# Altium footprint library Connectors.PcbLib: 92 footprints (part 1 of 6)
Each footprint in its own frame and in the unit in brackets; x right, y up, seen from the top. Pads: shape width x height; smd on the part's side, far side on the other; paste and mask are expansions set on the pad; w line width, h text height; cw(c..) or ccw(c..) is an arc to the next point about the centre after c.
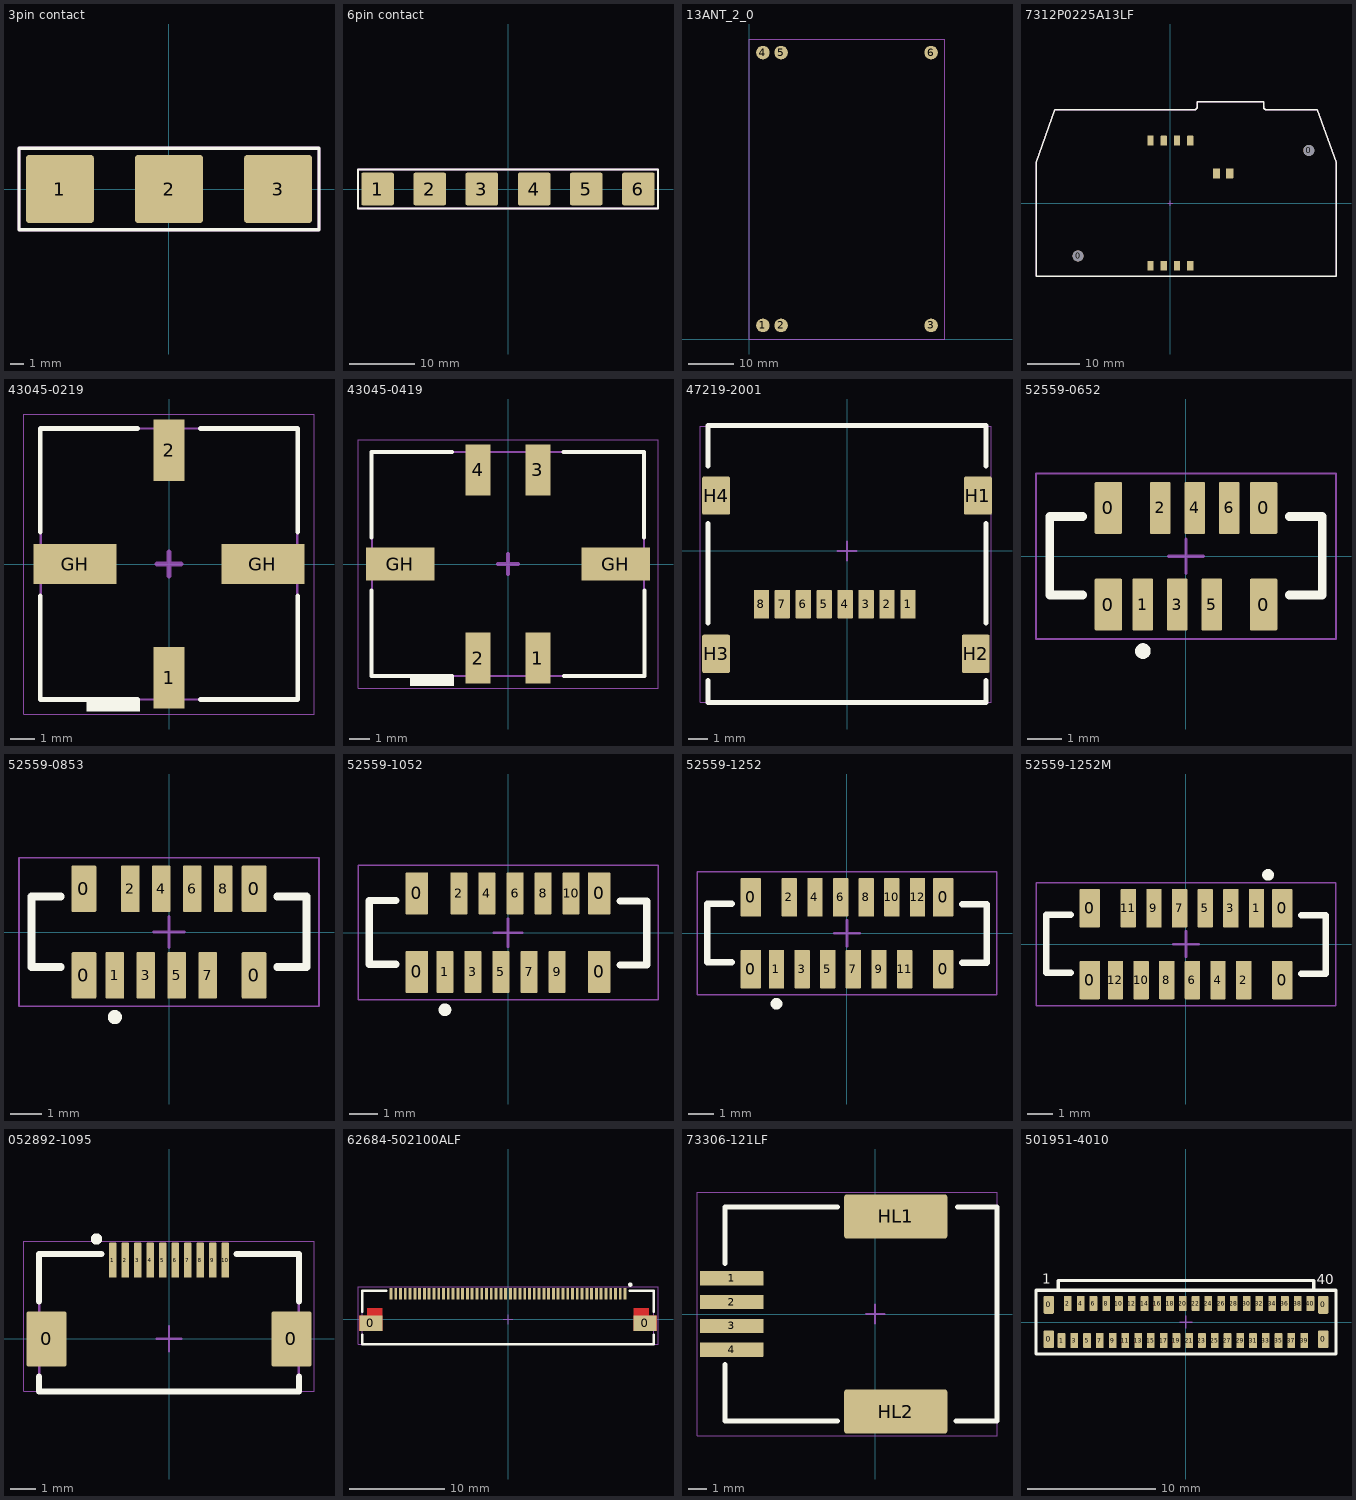
[diagram p0: the footprints below, top view; thin cyan lines are the x and y axes]

## 3pin contact [mm]
pads (3):
  rrect10% 5x5 smd: 1(-8,0) 2(0,0) 3(8,0)
Top Overlay:
  lines w0.254: -11,-3 -11,3 11,3 11,-3 -11,-3
Mechanical 13:
  lines w0.254: -11,-3 11,-3 11,3 -11,3 -11,-3
  text ".Designator" at -1.995,4.025 h0.51
  text ".Comment" at -1.97,3.325 h0.51
Mechanical 15:
  lines w0.05: -11,-3 11,-3 11,3 -11,3 -11,-3
  lines w0.1: -0.5,0 0.5,0 ; 0,-0.5 0,0.5

## 6pin contact [mm]
pads (6):
  rrect10% 5x5 smd: 1(-20,0) 2(-12,0) 3(-4,0) 4(4,0) 5(12,0) 6(20,0)
Top Overlay:
  lines w0.254: -23,-3 23,-3 23,3 -23,3 -23,-3
Mechanical 13:
  lines w0.254: -23,-3 -23,3 23,3 23,-3 -23,-3
  text ".Comment" at -2.17,3.325 h0.51
  text ".Designator" at -2.195,4.025 h0.51
Mechanical 15:
  lines w0.05: -23,-3 -23,3 23,3 23,-3 -23,-3
  lines w0.1: -20.5,0 -19.5,0 ; -20,-0.5 -20,0.5

## 13ANT_2_0 [mm] "13.56MHz Y Soft Antenna v2.0"
height 4.5
pads (6):
  round 3 smd: 1(3,3) 2(7,3) 3(40,3) 4(3,63) 5(7,63) 6(40,63)
Mechanical 13:
  lines w0.1: 0,0 43,0 43,66 0,66 0,0
  text ".Comment" at 19.83,2.525 h0.51
  text ".Designator" at 19.805,3.225 h0.51
Mechanical 15:
  lines w0.1: 0,0 0,66 43,66 43,0 0,0
3D body "OEM_LF_HF_Antenna_2.0.step": height 4.35, standoff 0, extent 0,0 43,66

## 7312P0225A13LF [mm] "Smart Card IC Chip Card Connector, 8 cts, Surface Mount"
height 3.6
pads (12):
  round 2.1 hole 2.1 unplated: 0(-17.78,-10.16) 0(26.67,10.16)
  rrect10% 1.2x1.9 smd: 1(-3.81,12.05) 2(-1.27,12.05) 3(1.27,12.05) 4(-3.81,-12.05) 5(-1.27,-12.05) 6(1.27,-12.05) 7(3.81,12.05) 8(3.81,-12.05)
  rrect10% 1.4x1.9 smd: 9(8.89,5.75) 10(11.43,5.75)
Top Overlay:
  lines w0.254: -25.89,-14.1 31.91,-14.1 31.91,7.9 28.26,18 18.53,18 cw(c18.53,18.56) 17.97,18.56 17.97,19.58 5.17,19.58 5.17,18.56 cw(c4.61,18.56) 4.61,18 -22.24,18 -25.89,7.9 -25.89,-14.1
Mechanical 13:
  text ".Designator" at -2.625,-2.015 h0.51
  text ".Comment" at -2.6,-2.715 h0.51
Mechanical 15:
  lines w0.1: -0.5,0 0.5,0 ; 0,-0.5 0,0.5 ; -25.89,-14.1 -25.89,7.9 -22.24,18 4.61,18 ccw(c4.61,18.56) 5.17,18.56 5.17,19.58 17.97,19.58 17.97,18.56 ccw(c18.53,18.56) 18.53,18 28.26,18 31.91,7.9 31.91,-14.1 -25.89,-14.1
3D body "7312P0225A13LFC.step": height 3.56, standoff -0.79, extent -25.92,-14.1 31.88,19.6

## 43045-0219 [mm] "Micro-Fit 3.0™ Vertical Header, 3.00mm Pitch, Dual Row, 2 Circuits, with Solder Tab"
height 9.91
pads (4):
  rect 1.27x2.54 smd: 1(0,-4.7) 2(0,4.7)
  rect 3.43x1.65 smd: GH(-3.885,0) GH(3.885,0)
Top Overlay:
  rectangle: -3.4,-6.1 -1.2,-5.6
  lines w0.2: -5.325,-1.325 -5.325,-5.6 -1.3,-5.6 ; -5.325,1.325 -5.325,5.6 -1.3,5.6 ; 1.3,-5.6 5.325,-5.6 5.325,-1.325 ; 1.3,5.6 5.325,5.6 5.325,1.325
Mechanical 13:
  lines w0.1: -5.3,-5.6 -5.3,5.6 5.3,5.6 5.3,-5.6 -5.3,-5.6
  text ".Designator" at -2.425,2.2 h0.51
  text ".Comment" at -2.4,1.5 h0.51
Mechanical 15:
  lines w0.05: -6,-6.2 -6,6.2 6,6.2 6,-6.2 -6,-6.2
  lines w0.2: -0.5,0 0.5,0 ; 0,-0.5 0,0.5
3D body "430450219.molex.stp": height 9.96, standoff 0, extent -5.325,-5.6 5.325,5.6

## 43045-0419 [mm] "Micro-Fit 3.0™ Vertical Header, 3.00mm Pitch, Dual Row, 4 Circuits, with Solder Tab"
height 9.91
pads (6):
  rect 1.27x2.54 smd: 1(1.5,-4.7) 2(-1.5,-4.7) 3(1.5,4.7) 4(-1.5,4.7)
  rect 3.43x1.65 smd: GH(-5.385,0) GH(5.385,0)
Top Overlay:
  rectangle: -4.9,-6.1 -2.7,-5.6
  lines w0.2: -6.825,-1.325 -6.825,-5.6 -2.8,-5.6 ; -6.825,1.325 -6.825,5.6 -2.8,5.6 ; 2.775,5.6 6.8,5.6 6.8,1.325 ; 2.8,-5.6 6.825,-5.6 6.825,-1.325
Mechanical 13:
  lines w0.1: -6.8,-5.6 6.8,-5.6 6.8,5.6 -6.8,5.6 -6.8,-5.6
  text ".Designator" at -2.125,0.1 h0.51
  text ".Comment" at -2.1,-0.6 h0.51
Mechanical 15:
  lines w0.05: -7.5,-6.2 7.5,-6.2 7.5,6.2 -7.5,6.2 -7.5,-6.2
  lines w0.2: -0.5,0 0.5,0 ; 0,-0.5 0,0.5
3D body "430450419.molex.stp": height 9.96, standoff 0, extent -6.825,-5.6 6.825,5.6

## 47219-2001 [mm]
height 1.1
pads (12):
  rrect10% 0.8x1.5 smd: 1(3.205,-2.8) 2(2.105,-2.8) 3(1.005,-2.8) 4(-0.095,-2.8) 5(-1.195,-2.8) 6(-2.295,-2.8) 7(-3.395,-2.8) 8(-4.495,-2.8)
  rrect10% 1.45x2 smd: H1(6.875,2.9) H2(6.76,-5.4) H3(-6.875,-5.4) H4(-6.875,2.9)
Top Overlay:
  lines w0.254: -7.295,-6.8 -7.295,-7.95 7.305,-7.95 7.305,-6.8 ; -7.295,-3.8 -7.295,1.45 ; -7.295,4.45 -7.295,6.575 7.305,6.575 7.305,4.45 ; 7.305,-3.8 7.305,1.45
Mechanical 13:
  text ".Comment" at -3.67,-1.475 h0.51
  text ".Designator" at -3.695,-0.775 h0.51
Mechanical 15:
  lines w0.05: -7.695,-7.95 -7.695,6.55 7.58,6.55 7.58,-7.95 -7.695,-7.95
  lines w0.1: -0.5,0 0.5,0 ; 0,-0.5 0,0.5
3D body "472192001.stp": height 1.9, standoff 0, extent -7.29,-7.955 7.31,6.545

## 52559-0652 [mm]
height 5.3
pads (10):
  rrect10% 0.8x1.5 smd: 0(-2.25,-1.4) 0(-2.25,1.4) 0(2.25,-1.4) 0(2.25,1.4)
  rrect10% 0.6x1.5 smd: 1(-1.25,-1.4) 2(-0.75,1.4) 3(-0.25,-1.4) 4(0.25,1.4) 5(0.75,-1.4) 6(1.25,1.4)
Top Overlay:
  circle w0.254: c-1.25,-2.75 r0.1
  lines w0.254: -3,-1.125 -3.95,-1.125 -3.95,1.15 -3,1.15 ; 3,-1.125 3.95,-1.125 3.95,1.15 3,1.15
Mechanical 13:
  lines w0.1: -3,-1.125 -3.95,-1.125 -3.95,1.15 -3,1.15 ; 3,-1.125 3.95,-1.125 3.95,1.15 3,1.15
  text ".Comment" at -2.3,-0.55 h0.51
  text ".Designator" at -2.325,0.15 h0.51
Mechanical 15:
  lines w0.05: -4.35,-2.4 4.35,-2.4 4.35,2.4 -4.35,2.4 -4.35,-2.4
  lines w0.1: -0.5,0 0.5,0 ; 0,-0.5 0,0.5
3D body "525590652.stp": height 5.3, standoff 0, extent -4.35,-1.65 4.35,1.85

## 52559-0853 [mm]
height 5.3
pads (12):
  rrect10% 0.8x1.5 smd: 0(-2.75,-1.4) 0(-2.75,1.4) 0(2.75,-1.4) 0(2.75,1.4)
  rrect10% 0.6x1.5 smd: 1(-1.75,-1.4) 2(-1.25,1.4) 3(-0.75,-1.4) 4(-0.25,1.4) 5(0.25,-1.4) 6(0.75,1.4) 7(1.25,-1.4) 8(1.75,1.4)
Top Overlay:
  circle w0.254: c-1.75,-2.75 r0.1
  lines w0.254: -3.5,-1.125 -4.45,-1.125 -4.45,1.15 -3.5,1.15 ; 3.5,-1.125 4.45,-1.125 4.45,1.15 3.5,1.15
Mechanical 13:
  lines w0.1: -3.5,-1.125 -4.45,-1.125 -4.45,1.15 -3.5,1.15 ; 3.5,-1.125 4.45,-1.125 4.45,1.15 3.5,1.15
  text ".Designator" at -2.55,0.2 h0.51
  text ".Comment" at -2.525,-0.5 h0.51
Mechanical 15:
  lines w0.05: -4.85,-2.4 -4.85,2.4 4.85,2.4 4.85,-2.4 -4.85,-2.4
  lines w0.1: -0.5,0 0.5,0 ; 0,-0.5 0,0.5
3D body "525590853.stp": height 5.3, standoff 0, extent -4.85,-1.65 4.85,1.85

## 52559-1052 [mm]
height 5.3
pads (14):
  rrect10% 0.8x1.5 smd: 0(-3.25,-1.4) 0(-3.25,1.4) 0(3.25,-1.4) 0(3.25,1.4)
  rrect10% 0.6x1.5 smd: 1(-2.25,-1.4) 2(-1.75,1.4) 3(-1.25,-1.4) 4(-0.75,1.4) 5(-0.25,-1.4) 6(0.25,1.4) 7(0.75,-1.4) 8(1.25,1.4) 9(1.75,-1.4) 10(2.25,1.4)
Top Overlay:
  circle w0.254: c-2.25,-2.75 r0.1
  lines w0.254: -4,-1.125 -4.95,-1.125 -4.95,1.15 -4,1.15 ; 4,-1.15 4.95,-1.15 4.95,1.125 4,1.125
Mechanical 13:
  lines w0.1: -4,-1.125 -4.95,-1.125 -4.95,1.15 -4,1.15 ; 4,-1.15 4.95,-1.15 4.95,1.125 4,1.125
  text ".Comment" at -2.225,-0.55 h0.51
  text ".Designator" at -2.25,0.15 h0.51
Mechanical 15:
  lines w0.05: -5.35,-2.4 -5.35,2.4 5.35,2.4 5.35,-2.4 -5.35,-2.4
  lines w0.1: -0.5,0 0.5,0 ; 0,-0.5 0,0.5
3D body "525591052.stp": height 5.3, standoff 0, extent -5.35,-1.65 5.35,1.85

## 52559-1252 [mm] "Easy-On™ Type FFC/FPC Connector, Vertical, Surface Mount, ZIF, 12 Circuits"
height 5.3
pads (16):
  rrect10% 0.8x1.5 smd: 0(-3.75,-1.4) 0(-3.75,1.4) 0(3.75,-1.4) 0(3.75,1.4)
  rrect10% 0.6x1.5 smd: 1(-2.75,-1.4) 2(-2.25,1.4) 3(-1.75,-1.4) 4(-1.25,1.4) 5(-0.75,-1.4) 6(-0.25,1.4) 7(0.25,-1.4) 8(0.75,1.4) 9(1.25,-1.4) 10(1.75,1.4) 11(2.25,-1.4) 12(2.75,1.4)
Top Overlay:
  circle w0.254: c-2.75,-2.75 r0.1
  lines w0.254: -4.5,-1.125 -5.45,-1.125 -5.45,1.15 -4.5,1.15 ; 4.5,-1.15 5.45,-1.15 5.45,1.125 4.5,1.125
Mechanical 13:
  lines w0.1: -4.5,-1.125 -5.45,-1.125 -5.45,1.15 -4.5,1.15 ; 4.5,-1.15 5.45,-1.15 5.45,1.125 4.5,1.125
  text ".Designator" at -2.75,0.15 h0.51
  text ".Comment" at -2.725,-0.55 h0.51
Mechanical 15:
  lines w0.05: -5.85,-2.4 5.85,-2.4 5.85,2.4 -5.85,2.4 -5.85,-2.4
  lines w0.1: -0.5,0 0.5,0 ; 0,-0.5 0,0.5
3D body "525591252.stp": height 5.3, standoff 0, extent -5.85,-1.65 5.85,1.85

## 52559-1252M [mm] "Easy-On™ Type FFC/FPC Connector, Vertical, Surface Mount, ZIF, 12 Circuits, mirrored"
height 5.3
pads (16):
  rrect10% 0.8x1.5 smd: 0(-3.75,-1.4) 0(-3.75,1.4) 0(3.75,-1.4) 0(3.75,1.4)
  rrect10% 0.6x1.5 smd: 1(2.75,1.4) 2(2.25,-1.4) 3(1.75,1.4) 4(1.25,-1.4) 5(0.75,1.4) 6(0.25,-1.4) 7(-0.25,1.4) 8(-0.75,-1.4) 9(-1.25,1.4) 10(-1.75,-1.4) 11(-2.25,1.4) 12(-2.75,-1.4)
Top Overlay:
  circle w0.254: c3.2,2.7 r0.1
  lines w0.254: -4.5,-1.125 -5.45,-1.125 -5.45,1.15 -4.5,1.15 ; 4.5,-1.15 5.45,-1.15 5.45,1.125 4.5,1.125
Mechanical 13:
  lines w0.1: -4.5,-1.125 -5.45,-1.125 -5.45,1.15 -4.5,1.15 ; 4.5,-1.15 5.45,-1.15 5.45,1.125 4.5,1.125
  text ".Designator" at -2.75,0.15 h0.51
  text ".Comment" at -2.725,-0.55 h0.51
Mechanical 15:
  lines w0.05: -5.85,-2.4 5.85,-2.4 5.85,2.4 -5.85,2.4 -5.85,-2.4
  lines w0.1: -0.5,0 0.5,0 ; 0,-0.5 0,0.5
3D body "525591252.stp": height 5.3, standoff 0, extent -5.85,-1.65 5.85,1.85

## 052892-1095 [mm] "FPC 10pin 0.5mm right angle, bottom contacts"
height 2
pads (12):
  rrect10% 1.6x2.2 smd: 0(-4.9,0) 0(4.9,0)
  rrect10% 0.3x1.4 smd: 1(-2.25,3.15) 2(-1.75,3.15) 3(-1.25,3.15) 4(-0.75,3.15) 5(-0.25,3.15) 6(0.25,3.15) 7(0.75,3.15) 8(1.25,3.15) 9(1.75,3.15) 10(2.25,3.15)
Top Overlay:
  circle w0.254: c-2.9,4 r0.1
  lines w0.254: -5.2,-2.1 -5.2,-1.5 ; -5.2,-2.1 0,-2.1 5.2,-2.1 ; -5.2,1.5 -5.2,3.4 -2.7,3.4 ; 2.7,3.4 5.2,3.4 5.2,1.5 ; 5.2,-2.1 5.2,-1.5
Mechanical 13:
  lines w0.1: -2.7,3.4 -5.2,3.4 -5.2,-2.1 0,-2.1 5.2,-2.1 5.2,3.4 2.7,3.4
  text ".Comment" at -2.225,-0.55 h0.51
  text ".Designator" at -2.25,0.15 h0.51
Mechanical 15:
  lines w0.05: -5.8,-2.1 -5.8,3.9 5.8,3.9 5.8,-2.1 -5.8,-2.1
  lines w0.1: -0.5,0 0.5,0 ; 0,-0.5 0,0.5
3D body "528921095.stp": height 2, standoff -0.04, extent -5.2,-2.1 5.2,3.4

## 62684-502100ALF [mm] "FPC 50pin 0.5mm right angle, top contacts"
height 2
pads (52):
  rect 2.4x1.6 smd: 0(-14.35,-0.4) 0(14.35,-0.4)
  rrect10% 0.3x1.2 smd: 1(12.25,2.7) 2(11.75,2.7) 3(11.25,2.7) 4(10.75,2.7) 5(10.25,2.7) 6(9.75,2.7) 7(9.25,2.7) 8(8.75,2.7) 9(8.25,2.7) 10(7.75,2.7) 11(7.25,2.7) 12(6.75,2.7) 13(6.25,2.7) 14(5.75,2.7) 15(5.25,2.7) 16(4.75,2.7) 17(4.25,2.7) 18(3.75,2.7) 19(3.25,2.7) 20(2.75,2.7) 21(2.25,2.7) 22(1.75,2.7) 23(1.25,2.7) 24(0.75,2.7) 25(0.25,2.7) 26(-0.25,2.7) 27(-0.75,2.7) 28(-1.25,2.7) 29(-1.75,2.7) 30(-2.25,2.7) 31(-2.75,2.7) 32(-3.25,2.7) 33(-3.75,2.7) 34(-4.25,2.7) 35(-4.75,2.7) 36(-5.25,2.7) 37(-5.75,2.7) 38(-6.25,2.7) 39(-6.75,2.7) 40(-7.25,2.7) 41(-7.75,2.7) 42(-8.25,2.7) 43(-8.75,2.7) 44(-9.25,2.7) 45(-9.75,2.7) 46(-10.25,2.7) 47(-10.75,2.7) 48(-11.25,2.7) 49(-11.75,2.7) 50(-12.25,2.7)
Top Layer:
  region: 14.75,1.2 14.75,0.4 15.55,0.4 15.55,-1.2 13.15,-1.2 13.15,1.2
  region: -14.75,1.2 -14.75,0.4 -15.55,0.4 -15.55,-1.2 -13.15,-1.2 -13.15,1.2
Top Overlay:
  circle w0.254: c12.8,3.65 r0.1
  lines w0.254: -15.25,-1.6 -15.25,-2.6 0,-2.6 15.25,-2.6 15.25,-1.6 ; -15.25,0.8 -15.25,3 -12.75,3 ; 12.75,3 15.25,3 15.25,0.8
Mechanical 13:
  lines w0.1: -12.75,3 -15.25,3 -15.25,-2.6 0,-2.6 15.25,-2.6 15.25,3 12.75,3
  text ".Comment" at -2.225,-0.55 h0.51
  text ".Designator" at -2.25,0.15 h0.51
Mechanical 15:
  lines w0.05: -15.7,-2.6 -15.7,3.45 15.7,3.45 15.7,-2.6 -15.7,-2.6
  lines w0.1: -0.5,0 0.5,0 ; 0,-0.5 0,0.5
3D body "62684502100alf-1.stp": height 2, standoff -0.05, extent -15.25,-2.6 15.25,3

## 73306-121LF [mm]
height 14
pads (6):
  rrect10% 3.4x0.76 smd: 1(-7.65,1.905) 2(-7.65,0.635) 3(-7.65,-0.635) 4(-7.65,-1.905)
  rrect10% 5.5x2.35 smd: HL1(1.1,5.2) HL2(1.1,-5.2)
Top Overlay:
  lines w0.254: -8,-2.7 -8,-5.7 -2,-5.7 ; -8,2.7 -8,5.7 -2,5.7 ; 4.3,-5.7 6.5,-5.7 6.5,-1.45 6.5,5.7 4.4,5.7
Mechanical 13:
  lines w0.1: -8,-2.7 -8,-5.7 -2,-5.7 ; -8,2.7 -8,5.7 -2,5.7 ; 4.3,-5.7 6.5,-5.7 6.5,-1.45 6.5,5.7 4.4,5.7
  text ".Comment" at -1.875,7.2 h0.51
  text ".Designator" at -1.9,7.9 h0.51
Mechanical 15:
  lines w0.05: -9.5,-6.5 -9.5,6.5 6.5,6.5 6.5,-6.5 -9.5,-6.5
  lines w0.1: -0.5,0 0.5,0 ; 0,-0.5 0,0.5
3D body "73306-121LF.step": height 14.35, standoff 0, extent -8.95,-5.84 6.35,5.84

## 501951-4010 [mm] "0.50mm Pitch Easy-On™ Type FFC/FPC Connector, Vertical, Surface Mount, Gold Plating, 40 Circuits"
height 4.34
pads (44):
  rrect20% 0.8x1.4 smd: 0(-10.75,-1.35) 0(-10.75,1.35) 0(10.75,-1.35) 0(10.75,1.35)
  rrect20% 0.6x1.2 smd: 1(-9.75,-1.45) 2(-9.25,1.45) 3(-8.75,-1.45) 4(-8.25,1.45) 5(-7.75,-1.45) 6(-7.25,1.45) 7(-6.75,-1.45) 8(-6.25,1.45) 9(-5.75,-1.45) 10(-5.25,1.45) 11(-4.75,-1.45) 12(-4.25,1.45) 13(-3.75,-1.45) 14(-3.25,1.45) 15(-2.75,-1.45) 16(-2.25,1.45) 17(-1.75,-1.45) 18(-1.25,1.45) 19(-0.75,-1.45) 20(-0.25,1.45) 21(0.25,-1.45) 22(0.75,1.45) 23(1.25,-1.45) 24(1.75,1.45) 25(2.25,-1.45) 26(2.75,1.45) 27(3.25,-1.45) 28(3.75,1.45) 29(4.25,-1.45) 30(4.75,1.45) 31(5.25,-1.45) 32(5.75,1.45) 33(6.25,-1.45) 34(6.75,1.45) 35(7.25,-1.45) 36(7.75,1.45) 37(8.25,-1.45) 38(8.75,1.45) 39(9.25,-1.45) 40(9.75,1.45)
Top Overlay:
  lines w0.254: -10,2.5 -10,3.25 10,3.25 10,2.5 ; -11.75,-2.5 -11.75,2.5 11.75,2.5 11.75,-2.5 -11.75,-2.5
  text "40" at 10.25,2.95 h0.76
  text "1" at -11.25,3 h0.76
Mechanical 13:
  text ".Designator" at -10,3.5 h0.51
  text ".Comment" at -4,3.5 h0.51
Mechanical 15:
  lines w0.1: -0.5,0 0.5,0 ; 0,-0.5 0,0.5
3D body "5019514010.stp": height 4.05, standoff 0, extent -11.4,-1.85 11.4,2.65